# Altium schematic symbol library jlcpcb_2025_04_capacitors_extended_1210.schlib: 709 symbols (part 2 of 4) (continued)
## C3225C0G2J682JT000N
designator C?  Capacitance: 6.8nF  (hidden comment: *)
Capacitor, Ceramic (MLCC), 6.8nF, ±5%, 630V, C0G, ±5%, SMD 1210; Manufacturer: TDK; Manufacturer Part Number: C3225C0G2J682JT000N; Package Size: 1210; JLCPCB Basic Part: No; JLCPCB Part Number: C342731; Supplier 1: LCSC; Category: Capacitors - MLCC; Supplier Part Number 1: C342731; Tolerance: ±5%; Voltage Rating: 630V; Temperature Coefficient: C0G; RoHS: Yes; ComponentLink1Description: Datasheet; ComponentLink1URL: https://wmsc.lcsc.com/wmsc/upload/file/pdf/v2/lcsc/2304140030_TDK-C3225C0G2J682JT000N_C342731.pdf; ComponentLink2Description: JLCPCB Part URL; ComponentLink2URL: https://jlcpcb.com/partdetail/C342731; ComponentLink3Description: LCSC Part URL; ComponentLink3URL: https://lcsc.com/product-detail/Multilayer-Ceramic-Capacitors-MLCC---SMD-SMT_TDK-TDK-C3225C0G2J682JT000N_C342731.html
footprint CAP-1210 (1210 (3225M) Capacitor)
pins: 1, 2

## C3225C0G3A222JT000N
designator C?  Capacitance: 2.2nF  (hidden comment: *)
Capacitor, Ceramic (MLCC), 2.2nF, ±5%, 1kV, C0G, ±5%, SMD 1210; Manufacturer: TDK; Manufacturer Part Number: C3225C0G3A222JT000N; Package Size: 1210; JLCPCB Basic Part: No; JLCPCB Part Number: C2991838; Supplier 1: LCSC; Category: Capacitors - MLCC; Supplier Part Number 1: C2991838; Tolerance: ±5%; Voltage Rating: 1kV; Temperature Coefficient: C0G; RoHS: Yes; ComponentLink1Description: Datasheet; ComponentLink1URL: https://wmsc.lcsc.com/wmsc/upload/file/pdf/v2/lcsc/2204151015_TDK-C3225C0G3A222JT000N_C2991838.pdf; ComponentLink2Description: JLCPCB Part URL; ComponentLink2URL: https://jlcpcb.com/partdetail/C2991838; ComponentLink3Description: LCSC Part URL; ComponentLink3URL: https://lcsc.com/product-detail/Multilayer-Ceramic-Capacitors-MLCC---SMD-SMT_TDK-TDK-C3225C0G3A222JT000N_C2991838.html
footprint CAP-1210 (1210 (3225M) Capacitor)
pins: 1, 2

## C3225X5R0J476MT000N
designator C?  Capacitance: 47uF  (hidden comment: *)
Capacitor, Ceramic (MLCC), 47uF, ±20%, 6.3V, X5R, ±20%, SMD 1210; Manufacturer: TDK; Manufacturer Part Number: C3225X5R0J476MT000N; Package Size: 1210; JLCPCB Basic Part: No; JLCPCB Part Number: C338024; Supplier 1: LCSC; Category: Capacitors - MLCC; Supplier Part Number 1: C338024; Tolerance: ±20%; Voltage Rating: 6.3V; Temperature Coefficient: X5R; RoHS: Yes; ComponentLink1Description: Datasheet; ComponentLink1URL: https://wmsc.lcsc.com/wmsc/upload/file/pdf/v2/lcsc/2304140030_TDK-C3225X5R0J476MT000N_C338024.pdf; ComponentLink2Description: JLCPCB Part URL; ComponentLink2URL: https://jlcpcb.com/partdetail/C338024; ComponentLink3Description: LCSC Part URL; ComponentLink3URL: https://lcsc.com/product-detail/Multilayer-Ceramic-Capacitors-MLCC---SMD-SMT_TDK-TDK-C3225X5R0J476MT000N_C338024.html
footprint CAP-1210 (1210 (3225M) Capacitor)
pins: 1, 2

## C3225X5R1A336MT0A0E
designator C?  Capacitance: 33uF  (hidden comment: *)
Capacitor, Ceramic (MLCC), 33uF, ±20%, 10V, X5R, ±20%, SMD 1210; Manufacturer: TDK; Manufacturer Part Number: C3225X5R1A336MT0A0E; Package Size: 1210; JLCPCB Basic Part: No; JLCPCB Part Number: C531418; Supplier 1: LCSC; Category: Capacitors - MLCC; Supplier Part Number 1: C531418; Tolerance: ±20%; Voltage Rating: 10V; Temperature Coefficient: X5R; RoHS: Yes; ComponentLink1Description: Datasheet; ComponentLink2Description: JLCPCB Part URL; ComponentLink2URL: https://jlcpcb.com/partdetail/C531418; ComponentLink3Description: LCSC Part URL; ComponentLink3URL: https://lcsc.com/product-detail/Multilayer-Ceramic-Capacitors-MLCC---SMD-SMT_TDK-TDK-C3225X5R1A336MT0A0E_C531418.html
footprint CAP-1210 (1210 (3225M) Capacitor)
pins: 1, 2

## C3225X5R1A476MT000E
designator C?  Capacitance: 47uF  (hidden comment: *)
Capacitor, Ceramic (MLCC), 47uF, ±20%, 10V, X5R, ±20%, SMD 1210; Manufacturer: TDK; Manufacturer Part Number: C3225X5R1A476MT000E; Package Size: 1210; JLCPCB Basic Part: No; JLCPCB Part Number: C76680; Supplier 1: LCSC; Category: Capacitors - MLCC; Supplier Part Number 1: C76680; Tolerance: ±20%; Voltage Rating: 10V; Temperature Coefficient: X5R; RoHS: Yes; ComponentLink1Description: Datasheet; ComponentLink1URL: https://wmsc.lcsc.com/wmsc/upload/file/pdf/v2/lcsc/2304140030_TDK-C3225X5R1A476MT000E_C76680.pdf; ComponentLink2Description: JLCPCB Part URL; ComponentLink2URL: https://jlcpcb.com/partdetail/C76680; ComponentLink3Description: LCSC Part URL; ComponentLink3URL: https://lcsc.com/product-detail/Multilayer-Ceramic-Capacitors-MLCC---SMD-SMT_TDK-TDK-C3225X5R1A476MT000E_C76680.html
footprint CAP-1210 (1210 (3225M) Capacitor)
pins: 1, 2

## C3225X5R1C226KT000N
designator C?  Capacitance: 22uF  (hidden comment: *)
Capacitor, Ceramic (MLCC), 22uF, ±10%, 16V, X5R, ±10%, SMD 1210; Manufacturer: TDK; Manufacturer Part Number: C3225X5R1C226KT000N; Package Size: 1210; JLCPCB Basic Part: No; JLCPCB Part Number: C329935; Supplier 1: LCSC; Category: Capacitors - MLCC; Supplier Part Number 1: C329935; Tolerance: ±10%; Voltage Rating: 16V; Temperature Coefficient: X5R; RoHS: Yes; ComponentLink1Description: Datasheet; ComponentLink1URL: https://wmsc.lcsc.com/wmsc/upload/file/pdf/v2/lcsc/2304140030_TDK-C3225X5R1C226KT000N_C329935.pdf; ComponentLink2Description: JLCPCB Part URL; ComponentLink2URL: https://jlcpcb.com/partdetail/C329935; ComponentLink3Description: LCSC Part URL; ComponentLink3URL: https://lcsc.com/product-detail/Multilayer-Ceramic-Capacitors-MLCC---SMD-SMT_TDK-TDK-C3225X5R1C226KT000N_C329935.html
footprint CAP-1210 (1210 (3225M) Capacitor)
pins: 1, 2

## C3225X5R1C226MT000N
designator C?  Capacitance: 22uF  (hidden comment: *)
Capacitor, Ceramic (MLCC), 22uF, ±20%, 16V, X5R, ±20%, SMD 1210; Manufacturer: TDK; Manufacturer Part Number: C3225X5R1C226MT000N; Package Size: 1210; JLCPCB Basic Part: No; JLCPCB Part Number: C329959; Supplier 1: LCSC; Category: Capacitors - MLCC; Supplier Part Number 1: C329959; Tolerance: ±20%; Voltage Rating: 16V; Temperature Coefficient: X5R; RoHS: Yes; ComponentLink1Description: Datasheet; ComponentLink1URL: https://wmsc.lcsc.com/wmsc/upload/file/pdf/v2/lcsc/2304140030_TDK-C3225X5R1C226MT000N_C329959.pdf; ComponentLink2Description: JLCPCB Part URL; ComponentLink2URL: https://jlcpcb.com/partdetail/C329959; ComponentLink3Description: LCSC Part URL; ComponentLink3URL: https://lcsc.com/product-detail/Multilayer-Ceramic-Capacitors-MLCC---SMD-SMT_TDK-TDK-C3225X5R1C226MT000N_C329959.html
footprint CAP-1210 (1210 (3225M) Capacitor)
pins: 1, 2

## C3225X5R1E106KTJ00E
designator C?  Capacitance: 10uF  (hidden comment: *)
Capacitor, Ceramic (MLCC), 10uF, ±10%, 25V, X5R, ±10%, SMD 1210; Manufacturer: TDK; Manufacturer Part Number: C3225X5R1E106KTJ00E; Package Size: 1210; JLCPCB Basic Part: No; JLCPCB Part Number: C319188; Supplier 1: LCSC; Category: Capacitors - MLCC; Supplier Part Number 1: C319188; Tolerance: ±10%; Voltage Rating: 25V; Temperature Coefficient: X5R; RoHS: Yes; ComponentLink1Description: Datasheet; ComponentLink1URL: https://wmsc.lcsc.com/wmsc/upload/file/pdf/v2/lcsc/2304140030_TDK-C3225X5R1E106KTJ00E_C319188.pdf; ComponentLink2Description: JLCPCB Part URL; ComponentLink2URL: https://jlcpcb.com/partdetail/C319188; ComponentLink3Description: LCSC Part URL; ComponentLink3URL: https://lcsc.com/product-detail/Multilayer-Ceramic-Capacitors-MLCC---SMD-SMT_TDK-TDK-C3225X5R1E106KTJ00E_C319188.html
footprint CAP-1210 (1210 (3225M) Capacitor)
pins: 1, 2

## C3225X5R1E106MTJ00N
designator C?  Capacitance: 10uF  (hidden comment: *)
Capacitor, Ceramic (MLCC), 10uF, ±20%, 25V, X5R, ±20%, SMD 1210; Manufacturer: TDK; Manufacturer Part Number: C3225X5R1E106MTJ00N; Package Size: 1210; JLCPCB Basic Part: No; JLCPCB Part Number: C338001; Supplier 1: LCSC; Category: Capacitors - MLCC; Supplier Part Number 1: C338001; Tolerance: ±20%; Voltage Rating: 25V; Temperature Coefficient: X5R; RoHS: Yes; ComponentLink1Description: Datasheet; ComponentLink1URL: https://wmsc.lcsc.com/wmsc/upload/file/pdf/v2/lcsc/2304140030_TDK-C3225X5R1E106MTJ00N_C338001.pdf; ComponentLink2Description: JLCPCB Part URL; ComponentLink2URL: https://jlcpcb.com/partdetail/C338001; ComponentLink3Description: LCSC Part URL; ComponentLink3URL: https://lcsc.com/product-detail/Multilayer-Ceramic-Capacitors-MLCC---SMD-SMT_TDK-TDK-C3225X5R1E106MTJ00N_C338001.html
footprint CAP-1210 (1210 (3225M) Capacitor)
pins: 1, 2

## C3225X5R1E226KT000E
designator C?  Capacitance: 22uF  (hidden comment: *)
Capacitor, Ceramic (MLCC), 22uF, ±10%, 25V, X5R, ±10%, SMD 1210; Manufacturer: TDK; Manufacturer Part Number: C3225X5R1E226KT000E; Package Size: 1210; JLCPCB Basic Part: No; JLCPCB Part Number: C531419; Supplier 1: LCSC; Category: Capacitors - MLCC; Supplier Part Number 1: C531419; Tolerance: ±10%; Voltage Rating: 25V; Temperature Coefficient: X5R; RoHS: Yes; ComponentLink1Description: Datasheet; ComponentLink2Description: JLCPCB Part URL; ComponentLink2URL: https://jlcpcb.com/partdetail/C531419; ComponentLink3Description: LCSC Part URL; ComponentLink3URL: https://lcsc.com/product-detail/Multilayer-Ceramic-Capacitors-MLCC---SMD-SMT_TDK-TDK-C3225X5R1E226KT000E_C531419.html
footprint CAP-1210 (1210 (3225M) Capacitor)
pins: 1, 2

## C3225X5R1E226MT000E
designator C?  Capacitance: 22uF  (hidden comment: *)
Capacitor, Ceramic (MLCC), 22uF, ±20%, 25V, X5R, ±20%, SMD 1210; Manufacturer: TDK; Manufacturer Part Number: C3225X5R1E226MT000E; Package Size: 1210; JLCPCB Basic Part: No; JLCPCB Part Number: C329939; Supplier 1: LCSC; Category: Capacitors - MLCC; Supplier Part Number 1: C329939; Tolerance: ±20%; Voltage Rating: 25V; Temperature Coefficient: X5R; RoHS: Yes; ComponentLink1Description: Datasheet; ComponentLink1URL: https://wmsc.lcsc.com/wmsc/upload/file/pdf/v2/lcsc/2304140030_TDK-C3225X5R1E226MT000E_C329939.pdf; ComponentLink2Description: JLCPCB Part URL; ComponentLink2URL: https://jlcpcb.com/partdetail/C329939; ComponentLink3Description: LCSC Part URL; ComponentLink3URL: https://lcsc.com/product-detail/Multilayer-Ceramic-Capacitors-MLCC---SMD-SMT_TDK-TDK-C3225X5R1E226MT000E_C329939.html
footprint CAP-1210 (1210 (3225M) Capacitor)
pins: 1, 2

## C3225X5R1H106KT000N
designator C?  Capacitance: 10uF  (hidden comment: *)
Capacitor, Ceramic (MLCC), 10uF, ±10%, 50V, X5R, ±10%, SMD 1210; Manufacturer: TDK; Manufacturer Part Number: C3225X5R1H106KT000N; Package Size: 1210; JLCPCB Basic Part: No; JLCPCB Part Number: C342671; Supplier 1: LCSC; Category: Capacitors - MLCC; Supplier Part Number 1: C342671; Tolerance: ±10%; Voltage Rating: 50V; Temperature Coefficient: X5R; RoHS: Yes; ComponentLink1Description: Datasheet; ComponentLink1URL: https://wmsc.lcsc.com/wmsc/upload/file/pdf/v2/lcsc/2304140030_TDK-C3225X5R1H106KT000N_C342671.pdf; ComponentLink2Description: JLCPCB Part URL; ComponentLink2URL: https://jlcpcb.com/partdetail/C342671; ComponentLink3Description: LCSC Part URL; ComponentLink3URL: https://lcsc.com/product-detail/Multilayer-Ceramic-Capacitors-MLCC---SMD-SMT_TDK-TDK-C3225X5R1H106KT000N_C342671.html
footprint CAP-1210 (1210 (3225M) Capacitor)
pins: 1, 2

## C3225X7R1A226MTJ00N
designator C?  Capacitance: 22uF  (hidden comment: *)
Capacitor, Ceramic (MLCC), 22uF, ±20%, 10V, X7R, ±20%, SMD 1210; Manufacturer: TDK; Manufacturer Part Number: C3225X7R1A226MTJ00N; Package Size: 1210; JLCPCB Basic Part: No; JLCPCB Part Number: C695363; Supplier 1: LCSC; Category: Capacitors - MLCC; Supplier Part Number 1: C695363; Tolerance: ±20%; Voltage Rating: 10V; Temperature Coefficient: X7R; RoHS: Yes; ComponentLink1Description: Datasheet; ComponentLink1URL: https://wmsc.lcsc.com/wmsc/upload/file/pdf/v2/lcsc/2304140030_TDK-C3225X7R1A226MTJ00N_C695363.pdf; ComponentLink2Description: JLCPCB Part URL; ComponentLink2URL: https://jlcpcb.com/partdetail/C695363; ComponentLink3Description: LCSC Part URL; ComponentLink3URL: https://lcsc.com/product-detail/Multilayer-Ceramic-Capacitors-MLCC---SMD-SMT_TDK-TDK-C3225X7R1A226MTJ00N_C695363.html
footprint CAP-1210 (1210 (3225M) Capacitor)
pins: 1, 2

## C3225X7R1C106KT000N
designator C?  Capacitance: 10uF  (hidden comment: *)
Capacitor, Ceramic (MLCC), 10uF, ±10%, 16V, X7R, ±10%, SMD 1210; Manufacturer: TDK; Manufacturer Part Number: C3225X7R1C106KT000N; Package Size: 1210; JLCPCB Basic Part: No; JLCPCB Part Number: C319189; Supplier 1: LCSC; Category: Capacitors - MLCC; Supplier Part Number 1: C319189; Tolerance: ±10%; Voltage Rating: 16V; Temperature Coefficient: X7R; RoHS: Yes; ComponentLink1Description: Datasheet; ComponentLink1URL: https://wmsc.lcsc.com/wmsc/upload/file/pdf/v2/lcsc/2304140030_TDK-C3225X7R1C106KT000N_C319189.pdf; ComponentLink2Description: JLCPCB Part URL; ComponentLink2URL: https://jlcpcb.com/partdetail/C319189; ComponentLink3Description: LCSC Part URL; ComponentLink3URL: https://lcsc.com/product-detail/Multilayer-Ceramic-Capacitors-MLCC---SMD-SMT_TDK-TDK-C3225X7R1C106KT000N_C319189.html
footprint CAP-1210 (1210 (3225M) Capacitor)
pins: 1, 2

## C3225X7R1C156MT000N
designator C?  Capacitance: 15uF  (hidden comment: *)
Capacitor, Ceramic (MLCC), 15uF, ±20%, 16V, X7R, ±20%, SMD 1210; Manufacturer: TDK; Manufacturer Part Number: C3225X7R1C156MT000N; Package Size: 1210; JLCPCB Basic Part: No; JLCPCB Part Number: C694469; Supplier 1: LCSC; Category: Capacitors - MLCC; Supplier Part Number 1: C694469; Tolerance: ±20%; Voltage Rating: 16V; Temperature Coefficient: X7R; RoHS: Yes; ComponentLink1Description: Datasheet; ComponentLink1URL: https://wmsc.lcsc.com/wmsc/upload/file/pdf/v2/lcsc/2304140030_TDK-C3225X7R1C156MT000N_C694469.pdf; ComponentLink2Description: JLCPCB Part URL; ComponentLink2URL: https://jlcpcb.com/partdetail/C694469; ComponentLink3Description: LCSC Part URL; ComponentLink3URL: https://lcsc.com/product-detail/Multilayer-Ceramic-Capacitors-MLCC---SMD-SMT_TDK-TDK-C3225X7R1C156MT000N_C694469.html
footprint CAP-1210 (1210 (3225M) Capacitor)
pins: 1, 2

## C3225X7R1C226KT000N
designator C?  Capacitance: 22uF  (hidden comment: *)
Capacitor, Ceramic (MLCC), 22uF, ±10%, 16V, X7R, ±10%, SMD 1210; Manufacturer: TDK; Manufacturer Part Number: C3225X7R1C226KT000N; Package Size: 1210; JLCPCB Basic Part: No; JLCPCB Part Number: C342660; Supplier 1: LCSC; Category: Capacitors - MLCC; Supplier Part Number 1: C342660; Tolerance: ±10%; Voltage Rating: 16V; Temperature Coefficient: X7R; RoHS: Yes; ComponentLink1Description: Datasheet; ComponentLink1URL: https://wmsc.lcsc.com/wmsc/upload/file/pdf/v2/lcsc/2304140030_TDK-C3225X7R1C226KT000N_C342660.pdf; ComponentLink2Description: JLCPCB Part URL; ComponentLink2URL: https://jlcpcb.com/partdetail/C342660; ComponentLink3Description: LCSC Part URL; ComponentLink3URL: https://lcsc.com/product-detail/Multilayer-Ceramic-Capacitors-MLCC---SMD-SMT_TDK-TDK-C3225X7R1C226KT000N_C342660.html
footprint CAP-1210 (1210 (3225M) Capacitor)
pins: 1, 2

## C3225X7R1C226MT000N
designator C?  Capacitance: 22uF  (hidden comment: *)
Capacitor, Ceramic (MLCC), 22uF, ±20%, 16V, X7R, ±20%, SMD 1210; Manufacturer: TDK; Manufacturer Part Number: C3225X7R1C226MT000N; Package Size: 1210; JLCPCB Basic Part: No; JLCPCB Part Number: C342699; Supplier 1: LCSC; Category: Capacitors - MLCC; Supplier Part Number 1: C342699; Tolerance: ±20%; Voltage Rating: 16V; Temperature Coefficient: X7R; RoHS: Yes; ComponentLink1Description: Datasheet; ComponentLink1URL: https://wmsc.lcsc.com/wmsc/upload/file/pdf/v2/lcsc/2304140030_TDK-C3225X7R1C226MT000N_C342699.pdf; ComponentLink2Description: JLCPCB Part URL; ComponentLink2URL: https://jlcpcb.com/partdetail/C342699; ComponentLink3Description: LCSC Part URL; ComponentLink3URL: https://lcsc.com/product-detail/Multilayer-Ceramic-Capacitors-MLCC---SMD-SMT_TDK-TDK-C3225X7R1C226MT000N_C342699.html
footprint CAP-1210 (1210 (3225M) Capacitor)
pins: 1, 2

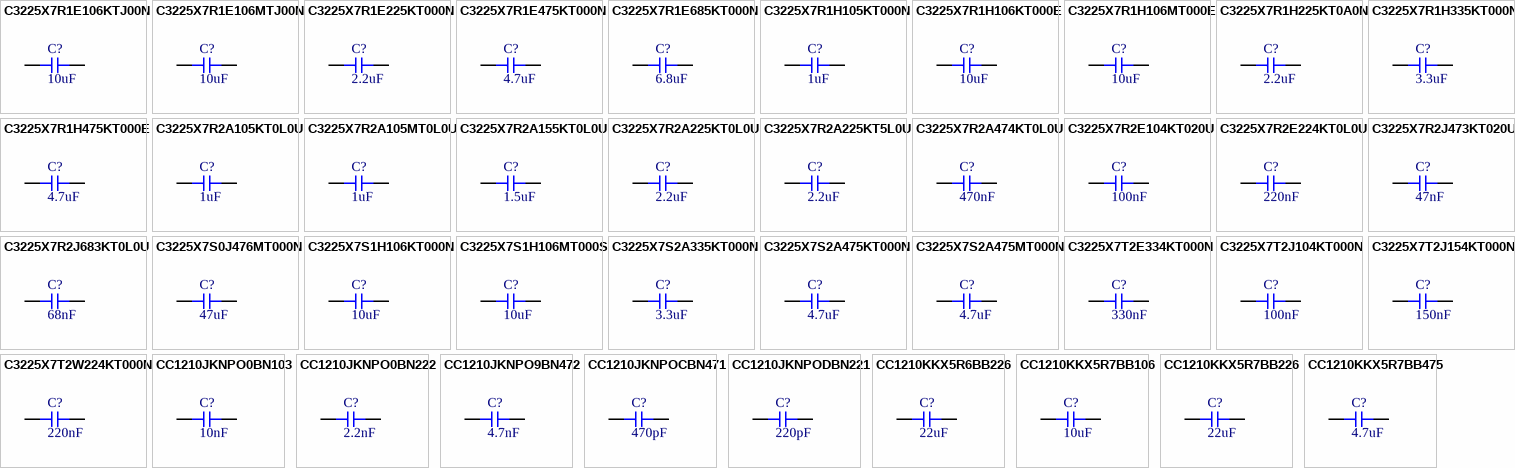
[diagram p6: symbols C3225X7R1E106KTJ00N to CC1210KKX5R7BB475]

## C3225X7R1E106KTJ00N
designator C?  Capacitance: 10uF  (hidden comment: *)
Capacitor, Ceramic (MLCC), 10uF, ±10%, 25V, X7R, ±10%, SMD 1210; Manufacturer: TDK; Manufacturer Part Number: C3225X7R1E106KTJ00N; Package Size: 1210; JLCPCB Basic Part: No; JLCPCB Part Number: C342744; Supplier 1: LCSC; Category: Capacitors - MLCC; Supplier Part Number 1: C342744; Tolerance: ±10%; Voltage Rating: 25V; Temperature Coefficient: X7R; RoHS: Yes; ComponentLink1Description: Datasheet; ComponentLink1URL: https://wmsc.lcsc.com/wmsc/upload/file/pdf/v2/lcsc/2304140030_TDK-C3225X7R1E106KTJ00N_C342744.pdf; ComponentLink2Description: JLCPCB Part URL; ComponentLink2URL: https://jlcpcb.com/partdetail/C342744; ComponentLink3Description: LCSC Part URL; ComponentLink3URL: https://lcsc.com/product-detail/Multilayer-Ceramic-Capacitors-MLCC---SMD-SMT_TDK-TDK-C3225X7R1E106KTJ00N_C342744.html
footprint CAP-1210 (1210 (3225M) Capacitor)
pins: 1, 2

## C3225X7R1E106MTJ00N
designator C?  Capacitance: 10uF  (hidden comment: *)
Capacitor, Ceramic (MLCC), 10uF, ±20%, 25V, X7R, ±20%, SMD 1210; Manufacturer: TDK; Manufacturer Part Number: C3225X7R1E106MTJ00N; Package Size: 1210; JLCPCB Basic Part: No; JLCPCB Part Number: C694198; Supplier 1: LCSC; Category: Capacitors - MLCC; Supplier Part Number 1: C694198; Tolerance: ±20%; Voltage Rating: 25V; Temperature Coefficient: X7R; RoHS: Yes; ComponentLink1Description: Datasheet; ComponentLink1URL: https://wmsc.lcsc.com/wmsc/upload/file/pdf/v2/lcsc/2304140030_TDK-C3225X7R1E106MTJ00N_C694198.pdf; ComponentLink2Description: JLCPCB Part URL; ComponentLink2URL: https://jlcpcb.com/partdetail/C694198; ComponentLink3Description: LCSC Part URL; ComponentLink3URL: https://lcsc.com/product-detail/Multilayer-Ceramic-Capacitors-MLCC---SMD-SMT_TDK-TDK-C3225X7R1E106MTJ00N_C694198.html
footprint CAP-1210 (1210 (3225M) Capacitor)
pins: 1, 2

## C3225X7R1E225KT000N
designator C?  Capacitance: 2.2uF  (hidden comment: *)
Capacitor, Ceramic (MLCC), 2.2uF, ±10%, 25V, X7R, ±10%, SMD 1210; Manufacturer: TDK; Manufacturer Part Number: C3225X7R1E225KT000N; Package Size: 1210; JLCPCB Basic Part: No; JLCPCB Part Number: C76681; Supplier 1: LCSC; Category: Capacitors - MLCC; Supplier Part Number 1: C76681; Tolerance: ±10%; Voltage Rating: 25V; Temperature Coefficient: X7R; RoHS: Yes; ComponentLink1Description: Datasheet; ComponentLink1URL: https://wmsc.lcsc.com/wmsc/upload/file/pdf/v2/lcsc/2304140030_TDK-C3225X7R1E225KT000N_C76681.pdf; ComponentLink2Description: JLCPCB Part URL; ComponentLink2URL: https://jlcpcb.com/partdetail/C76681; ComponentLink3Description: LCSC Part URL; ComponentLink3URL: https://lcsc.com/product-detail/Multilayer-Ceramic-Capacitors-MLCC---SMD-SMT_TDK-TDK-C3225X7R1E225KT000N_C76681.html
footprint CAP-1210 (1210 (3225M) Capacitor)
pins: 1, 2

## C3225X7R1E475KT000N
designator C?  Capacitance: 4.7uF  (hidden comment: *)
Capacitor, Ceramic (MLCC), 4.7uF, ±10%, 25V, X7R, ±10%, SMD 1210; Manufacturer: TDK; Manufacturer Part Number: C3225X7R1E475KT000N; Package Size: 1210; JLCPCB Basic Part: No; JLCPCB Part Number: C694471; Supplier 1: LCSC; Category: Capacitors - MLCC; Supplier Part Number 1: C694471; Tolerance: ±10%; Voltage Rating: 25V; Temperature Coefficient: X7R; RoHS: Yes; ComponentLink1Description: Datasheet; ComponentLink1URL: https://wmsc.lcsc.com/wmsc/upload/file/pdf/v2/lcsc/2304140030_TDK-C3225X7R1E475KT000N_C694471.pdf; ComponentLink2Description: JLCPCB Part URL; ComponentLink2URL: https://jlcpcb.com/partdetail/C694471; ComponentLink3Description: LCSC Part URL; ComponentLink3URL: https://lcsc.com/product-detail/Multilayer-Ceramic-Capacitors-MLCC---SMD-SMT_TDK-TDK-C3225X7R1E475KT000N_C694471.html
footprint CAP-1210 (1210 (3225M) Capacitor)
pins: 1, 2

## C3225X7R1E685KT000N
designator C?  Capacitance: 6.8uF  (hidden comment: *)
Capacitor, Ceramic (MLCC), 6.8uF, ±10%, 25V, X7R, ±10%, SMD 1210; Manufacturer: TDK; Manufacturer Part Number: C3225X7R1E685KT000N; Package Size: 1210; JLCPCB Basic Part: No; JLCPCB Part Number: C342705; Supplier 1: LCSC; Category: Capacitors - MLCC; Supplier Part Number 1: C342705; Tolerance: ±10%; Voltage Rating: 25V; Temperature Coefficient: X7R; RoHS: Yes; ComponentLink1Description: Datasheet; ComponentLink1URL: https://wmsc.lcsc.com/wmsc/upload/file/pdf/v2/lcsc/2304140030_TDK-C3225X7R1E685KT000N_C342705.pdf; ComponentLink2Description: JLCPCB Part URL; ComponentLink2URL: https://jlcpcb.com/partdetail/C342705; ComponentLink3Description: LCSC Part URL; ComponentLink3URL: https://lcsc.com/product-detail/Multilayer-Ceramic-Capacitors-MLCC---SMD-SMT_TDK-TDK-C3225X7R1E685KT000N_C342705.html
footprint CAP-1210 (1210 (3225M) Capacitor)
pins: 1, 2

## C3225X7R1H105KT000N
designator C?  Capacitance: 1uF  (hidden comment: *)
Capacitor, Ceramic (MLCC), 1uF, ±10%, 50V, X7R, ±10%, SMD 1210; Manufacturer: TDK; Manufacturer Part Number: C3225X7R1H105KT000N; Package Size: 1210; JLCPCB Basic Part: No; JLCPCB Part Number: C531420; Supplier 1: LCSC; Category: Capacitors - MLCC; Supplier Part Number 1: C531420; Tolerance: ±10%; Voltage Rating: 50V; Temperature Coefficient: X7R; RoHS: Yes; ComponentLink1Description: Datasheet; ComponentLink2Description: JLCPCB Part URL; ComponentLink2URL: https://jlcpcb.com/partdetail/C531420; ComponentLink3Description: LCSC Part URL; ComponentLink3URL: https://lcsc.com/product-detail/Multilayer-Ceramic-Capacitors-MLCC---SMD-SMT_TDK-TDK-C3225X7R1H105KT000N_C531420.html
footprint CAP-1210 (1210 (3225M) Capacitor)
pins: 1, 2

## C3225X7R1H106KT000E
designator C?  Capacitance: 10uF  (hidden comment: *)
Capacitor, Ceramic (MLCC), 10uF, ±10%, 50V, X7R, ±10%, SMD 1210; Manufacturer: TDK; Manufacturer Part Number: C3225X7R1H106KT000E; Package Size: 1210; JLCPCB Basic Part: No; JLCPCB Part Number: C432929; Supplier 1: LCSC; Category: Capacitors - MLCC; Supplier Part Number 1: C432929; Tolerance: ±10%; Voltage Rating: 50V; Temperature Coefficient: X7R; RoHS: Yes; ComponentLink1Description: Datasheet; ComponentLink1URL: https://wmsc.lcsc.com/wmsc/upload/file/pdf/v2/lcsc/2304140030_TDK-C3225X7R1H106KT000E_C432929.pdf; ComponentLink2Description: JLCPCB Part URL; ComponentLink2URL: https://jlcpcb.com/partdetail/C432929; ComponentLink3Description: LCSC Part URL; ComponentLink3URL: https://lcsc.com/product-detail/Multilayer-Ceramic-Capacitors-MLCC---SMD-SMT_TDK-TDK-C3225X7R1H106KT000E_C432929.html
footprint CAP-1210 (1210 (3225M) Capacitor)
pins: 1, 2

## C3225X7R1H106MT000E
designator C?  Capacitance: 10uF  (hidden comment: *)
Capacitor, Ceramic (MLCC), 10uF, ±20%, 50V, X7R, ±20%, SMD 1210; Manufacturer: TDK; Manufacturer Part Number: C3225X7R1H106MT000E; Package Size: 1210; JLCPCB Basic Part: No; JLCPCB Part Number: C342670; Supplier 1: LCSC; Category: Capacitors - MLCC; Supplier Part Number 1: C342670; Tolerance: ±20%; Voltage Rating: 50V; Temperature Coefficient: X7R; RoHS: Yes; ComponentLink1Description: Datasheet; ComponentLink1URL: https://wmsc.lcsc.com/wmsc/upload/file/pdf/v2/lcsc/2304140030_TDK-C3225X7R1H106MT000E_C342670.pdf; ComponentLink2Description: JLCPCB Part URL; ComponentLink2URL: https://jlcpcb.com/partdetail/C342670; ComponentLink3Description: LCSC Part URL; ComponentLink3URL: https://lcsc.com/product-detail/Multilayer-Ceramic-Capacitors-MLCC---SMD-SMT_TDK-TDK-C3225X7R1H106MT000E_C342670.html
footprint CAP-1210 (1210 (3225M) Capacitor)
pins: 1, 2

## C3225X7R1H225KT0A0N
designator C?  Capacitance: 2.2uF  (hidden comment: *)
Capacitor, Ceramic (MLCC), 2.2uF, ±10%, 50V, X7R, ±10%, SMD 1210; Manufacturer: TDK; Manufacturer Part Number: C3225X7R1H225KT0A0N; Package Size: 1210; JLCPCB Basic Part: No; JLCPCB Part Number: C695364; Supplier 1: LCSC; Category: Capacitors - MLCC; Supplier Part Number 1: C695364; Tolerance: ±10%; Voltage Rating: 50V; Temperature Coefficient: X7R; RoHS: Yes; ComponentLink1Description: Datasheet; ComponentLink1URL: https://wmsc.lcsc.com/wmsc/upload/file/pdf/v2/lcsc/2304140030_TDK-C3225X7R1H225KT0A0N_C695364.pdf; ComponentLink2Description: JLCPCB Part URL; ComponentLink2URL: https://jlcpcb.com/partdetail/C695364; ComponentLink3Description: LCSC Part URL; ComponentLink3URL: https://lcsc.com/product-detail/Multilayer-Ceramic-Capacitors-MLCC---SMD-SMT_TDK-TDK-C3225X7R1H225KT0A0N_C695364.html
footprint CAP-1210 (1210 (3225M) Capacitor)
pins: 1, 2

## C3225X7R1H335KT000N
designator C?  Capacitance: 3.3uF  (hidden comment: *)
Capacitor, Ceramic (MLCC), 3.3uF, ±10%, 50V, X7R, ±10%, SMD 1210; Manufacturer: TDK; Manufacturer Part Number: C3225X7R1H335KT000N; Package Size: 1210; JLCPCB Basic Part: No; JLCPCB Part Number: C117474; Supplier 1: LCSC; Category: Capacitors - MLCC; Supplier Part Number 1: C117474; Tolerance: ±10%; Voltage Rating: 50V; Temperature Coefficient: X7R; RoHS: Yes; ComponentLink1Description: Datasheet; ComponentLink1URL: https://wmsc.lcsc.com/wmsc/upload/file/pdf/v2/lcsc/1810201234_TDK-C3225X7R1H335KT000N_C117474.pdf; ComponentLink2Description: JLCPCB Part URL; ComponentLink2URL: https://jlcpcb.com/partdetail/C117474; ComponentLink3Description: LCSC Part URL; ComponentLink3URL: https://lcsc.com/product-detail/Multilayer-Ceramic-Capacitors-MLCC---SMD-SMT_TDK-TDK-C3225X7R1H335KT000N_C117474.html
footprint CAP-1210 (1210 (3225M) Capacitor)
pins: 1, 2

## C3225X7R1H475KT000E
designator C?  Capacitance: 4.7uF  (hidden comment: *)
Capacitor, Ceramic (MLCC), 4.7uF, ±10%, 50V, X7R, ±10%, SMD 1210; Manufacturer: TDK; Manufacturer Part Number: C3225X7R1H475KT000E; Package Size: 1210; JLCPCB Basic Part: No; JLCPCB Part Number: C76684; Supplier 1: LCSC; Category: Capacitors - MLCC; Supplier Part Number 1: C76684; Tolerance: ±10%; Voltage Rating: 50V; Temperature Coefficient: X7R; RoHS: Yes; ComponentLink1Description: Datasheet; ComponentLink1URL: https://wmsc.lcsc.com/wmsc/upload/file/pdf/v2/lcsc/2304140030_TDK-C3225X7R1H475KT000E_C76684.pdf; ComponentLink2Description: JLCPCB Part URL; ComponentLink2URL: https://jlcpcb.com/partdetail/C76684; ComponentLink3Description: LCSC Part URL; ComponentLink3URL: https://lcsc.com/product-detail/Multilayer-Ceramic-Capacitors-MLCC---SMD-SMT_TDK-TDK-C3225X7R1H475KT000E_C76684.html
footprint CAP-1210 (1210 (3225M) Capacitor)
pins: 1, 2

## C3225X7R2A105KT0L0U
designator C?  Capacitance: 1uF  (hidden comment: *)
Capacitor, Ceramic (MLCC), 1uF, ±10%, 100V, X7R, ±10%, SMD 1210; Manufacturer: TDK; Manufacturer Part Number: C3225X7R2A105KT0L0U; Package Size: 1210; JLCPCB Basic Part: No; JLCPCB Part Number: C342729; Supplier 1: LCSC; Category: Capacitors - MLCC; Supplier Part Number 1: C342729; Tolerance: ±10%; Voltage Rating: 100V; Temperature Coefficient: X7R; RoHS: Yes; ComponentLink1Description: Datasheet; ComponentLink1URL: https://wmsc.lcsc.com/wmsc/upload/file/pdf/v2/lcsc/2304140030_TDK-C3225X7R2A105KT0L0U_C342729.pdf; ComponentLink2Description: JLCPCB Part URL; ComponentLink2URL: https://jlcpcb.com/partdetail/C342729; ComponentLink3Description: LCSC Part URL; ComponentLink3URL: https://lcsc.com/product-detail/Multilayer-Ceramic-Capacitors-MLCC---SMD-SMT_TDK-TDK-C3225X7R2A105KT0L0U_C342729.html
footprint CAP-1210 (1210 (3225M) Capacitor)
pins: 1, 2

## C3225X7R2A105MT0L0U
designator C?  Capacitance: 1uF  (hidden comment: *)
Capacitor, Ceramic (MLCC), 1uF, ±20%, 100V, X7R, ±20%, SMD 1210; Manufacturer: TDK; Manufacturer Part Number: C3225X7R2A105MT0L0U; Package Size: 1210; JLCPCB Basic Part: No; JLCPCB Part Number: C342730; Supplier 1: LCSC; Category: Capacitors - MLCC; Supplier Part Number 1: C342730; Tolerance: ±20%; Voltage Rating: 100V; Temperature Coefficient: X7R; RoHS: Yes; ComponentLink1Description: Datasheet; ComponentLink1URL: https://wmsc.lcsc.com/wmsc/upload/file/pdf/v2/lcsc/2304140030_TDK-C3225X7R2A105MT0L0U_C342730.pdf; ComponentLink2Description: JLCPCB Part URL; ComponentLink2URL: https://jlcpcb.com/partdetail/C342730; ComponentLink3Description: LCSC Part URL; ComponentLink3URL: https://lcsc.com/product-detail/Multilayer-Ceramic-Capacitors-MLCC---SMD-SMT_TDK-TDK-C3225X7R2A105MT0L0U_C342730.html
footprint CAP-1210 (1210 (3225M) Capacitor)
pins: 1, 2

## C3225X7R2A155KT0L0U
designator C?  Capacitance: 1.5uF  (hidden comment: *)
Capacitor, Ceramic (MLCC), 1.5uF, ±10%, 100V, X7R, ±10%, SMD 1210; Manufacturer: TDK; Manufacturer Part Number: C3225X7R2A155KT0L0U; Package Size: 1210; JLCPCB Basic Part: No; JLCPCB Part Number: C342711; Supplier 1: LCSC; Category: Capacitors - MLCC; Supplier Part Number 1: C342711; Tolerance: ±10%; Voltage Rating: 100V; Temperature Coefficient: X7R; RoHS: Yes; ComponentLink1Description: Datasheet; ComponentLink1URL: https://wmsc.lcsc.com/wmsc/upload/file/pdf/v2/lcsc/2304140030_TDK-C3225X7R2A155KT0L0U_C342711.pdf; ComponentLink2Description: JLCPCB Part URL; ComponentLink2URL: https://jlcpcb.com/partdetail/C342711; ComponentLink3Description: LCSC Part URL; ComponentLink3URL: https://lcsc.com/product-detail/Multilayer-Ceramic-Capacitors-MLCC---SMD-SMT_TDK-TDK-C3225X7R2A155KT0L0U_C342711.html
footprint CAP-1210 (1210 (3225M) Capacitor)
pins: 1, 2

## C3225X7R2A225KT0L0U
designator C?  Capacitance: 2.2uF  (hidden comment: *)
Capacitor, Ceramic (MLCC), 2.2uF, ±10%, 100V, X7R, ±10%, SMD 1210; Manufacturer: TDK; Manufacturer Part Number: C3225X7R2A225KT0L0U; Package Size: 1210; JLCPCB Basic Part: No; JLCPCB Part Number: C76685; Supplier 1: LCSC; Category: Capacitors - MLCC; Supplier Part Number 1: C76685; Tolerance: ±10%; Voltage Rating: 100V; Temperature Coefficient: X7R; RoHS: Yes; ComponentLink1Description: Datasheet; ComponentLink1URL: https://wmsc.lcsc.com/wmsc/upload/file/pdf/v2/lcsc/2304140030_TDK-C3225X7R2A225KT0L0U_C76685.pdf; ComponentLink2Description: JLCPCB Part URL; ComponentLink2URL: https://jlcpcb.com/partdetail/C76685; ComponentLink3Description: LCSC Part URL; ComponentLink3URL: https://lcsc.com/product-detail/Multilayer-Ceramic-Capacitors-MLCC---SMD-SMT_TDK-TDK-C3225X7R2A225KT0L0U_C76685.html
footprint CAP-1210 (1210 (3225M) Capacitor)
pins: 1, 2

## C3225X7R2A225KT5L0U
designator C?  Capacitance: 2.2uF  (hidden comment: *)
Capacitor, Ceramic (MLCC), 2.2uF, ±10%, 100V, X7R, ±10%, SMD 1210; Manufacturer: TDK; Manufacturer Part Number: C3225X7R2A225KT5L0U; Package Size: 1210; JLCPCB Basic Part: No; JLCPCB Part Number: C76686; Supplier 1: LCSC; Category: Capacitors - MLCC; Supplier Part Number 1: C76686; Tolerance: ±10%; Voltage Rating: 100V; Temperature Coefficient: X7R; RoHS: Yes; ComponentLink1Description: Datasheet; ComponentLink1URL: https://wmsc.lcsc.com/wmsc/upload/file/pdf/v2/lcsc/2304140030_TDK-C3225X7R2A225KT5L0U_C76686.pdf; ComponentLink2Description: JLCPCB Part URL; ComponentLink2URL: https://jlcpcb.com/partdetail/C76686; ComponentLink3Description: LCSC Part URL; ComponentLink3URL: https://lcsc.com/product-detail/Multilayer-Ceramic-Capacitors-MLCC---SMD-SMT_TDK-TDK-C3225X7R2A225KT5L0U_C76686.html
footprint CAP-1210 (1210 (3225M) Capacitor)
pins: 1, 2

## C3225X7R2A474KT0L0U
designator C?  Capacitance: 470nF  (hidden comment: *)
Capacitor, Ceramic (MLCC), 470nF, ±10%, 100V, X7R, ±10%, SMD 1210; Manufacturer: TDK; Manufacturer Part Number: C3225X7R2A474KT0L0U; Package Size: 1210; JLCPCB Basic Part: No; JLCPCB Part Number: C76687; Supplier 1: LCSC; Category: Capacitors - MLCC; Supplier Part Number 1: C76687; Tolerance: ±10%; Voltage Rating: 100V; Temperature Coefficient: X7R; RoHS: Yes; ComponentLink1Description: Datasheet; ComponentLink1URL: https://wmsc.lcsc.com/wmsc/upload/file/pdf/v2/lcsc/2304140030_TDK-C3225X7R2A474KT0L0U_C76687.pdf; ComponentLink2Description: JLCPCB Part URL; ComponentLink2URL: https://jlcpcb.com/partdetail/C76687; ComponentLink3Description: LCSC Part URL; ComponentLink3URL: https://lcsc.com/product-detail/Multilayer-Ceramic-Capacitors-MLCC---SMD-SMT_TDK-TDK-C3225X7R2A474KT0L0U_C76687.html
footprint CAP-1210 (1210 (3225M) Capacitor)
pins: 1, 2

## C3225X7R2E104KT020U
designator C?  Capacitance: 100nF  (hidden comment: *)
Capacitor, Ceramic (MLCC), 100nF, ±10%, 250V, X7R, ±10%, SMD 1210; Manufacturer: TDK; Manufacturer Part Number: C3225X7R2E104KT020U; Package Size: 1210; JLCPCB Basic Part: No; JLCPCB Part Number: C76688; Supplier 1: LCSC; Category: Capacitors - MLCC; Supplier Part Number 1: C76688; Tolerance: ±10%; Voltage Rating: 250V; Temperature Coefficient: X7R; RoHS: Yes; ComponentLink1Description: Datasheet; ComponentLink1URL: https://wmsc.lcsc.com/wmsc/upload/file/pdf/v2/lcsc/2304140030_TDK-C3225X7R2E104KT020U_C76688.pdf; ComponentLink2Description: JLCPCB Part URL; ComponentLink2URL: https://jlcpcb.com/partdetail/C76688; ComponentLink3Description: LCSC Part URL; ComponentLink3URL: https://lcsc.com/product-detail/Multilayer-Ceramic-Capacitors-MLCC---SMD-SMT_TDK-TDK-C3225X7R2E104KT020U_C76688.html
footprint CAP-1210 (1210 (3225M) Capacitor)
pins: 1, 2

## C3225X7R2E224KT0L0U
designator C?  Capacitance: 220nF  (hidden comment: *)
Capacitor, Ceramic (MLCC), 220nF, ±10%, 250V, X7R, ±10%, SMD 1210; Manufacturer: TDK; Manufacturer Part Number: C3225X7R2E224KT0L0U; Package Size: 1210; JLCPCB Basic Part: No; JLCPCB Part Number: C342726; Supplier 1: LCSC; Category: Capacitors - MLCC; Supplier Part Number 1: C342726; Tolerance: ±10%; Voltage Rating: 250V; Temperature Coefficient: X7R; RoHS: Yes; ComponentLink1Description: Datasheet; ComponentLink1URL: https://wmsc.lcsc.com/wmsc/upload/file/pdf/v2/lcsc/2304140030_TDK-C3225X7R2E224KT0L0U_C342726.pdf; ComponentLink2Description: JLCPCB Part URL; ComponentLink2URL: https://jlcpcb.com/partdetail/C342726; ComponentLink3Description: LCSC Part URL; ComponentLink3URL: https://lcsc.com/product-detail/Multilayer-Ceramic-Capacitors-MLCC---SMD-SMT_TDK-TDK-C3225X7R2E224KT0L0U_C342726.html
footprint CAP-1210 (1210 (3225M) Capacitor)
pins: 1, 2

## C3225X7R2J473KT020U
designator C?  Capacitance: 47nF  (hidden comment: *)
Capacitor, Ceramic (MLCC), 47nF, ±10%, 630V, X7R, ±10%, SMD 1210; Manufacturer: TDK; Manufacturer Part Number: C3225X7R2J473KT020U; Package Size: 1210; JLCPCB Basic Part: No; JLCPCB Part Number: C342772; Supplier 1: LCSC; Category: Capacitors - MLCC; Supplier Part Number 1: C342772; Tolerance: ±10%; Voltage Rating: 630V; Temperature Coefficient: X7R; RoHS: Yes; ComponentLink1Description: Datasheet; ComponentLink1URL: https://wmsc.lcsc.com/wmsc/upload/file/pdf/v2/lcsc/2304140030_TDK-C3225X7R2J473KT020U_C342772.pdf; ComponentLink2Description: JLCPCB Part URL; ComponentLink2URL: https://jlcpcb.com/partdetail/C342772; ComponentLink3Description: LCSC Part URL; ComponentLink3URL: https://lcsc.com/product-detail/Multilayer-Ceramic-Capacitors-MLCC---SMD-SMT_TDK-TDK-C3225X7R2J473KT020U_C342772.html
footprint CAP-1210 (1210 (3225M) Capacitor)
pins: 1, 2

## C3225X7R2J683KT0L0U
designator C?  Capacitance: 68nF  (hidden comment: *)
Capacitor, Ceramic (MLCC), 68nF, ±10%, 630V, X7R, ±10%, SMD 1210; Manufacturer: TDK; Manufacturer Part Number: C3225X7R2J683KT0L0U; Package Size: 1210; JLCPCB Basic Part: No; JLCPCB Part Number: C342738; Supplier 1: LCSC; Category: Capacitors - MLCC; Supplier Part Number 1: C342738; Tolerance: ±10%; Voltage Rating: 630V; Temperature Coefficient: X7R; RoHS: Yes; ComponentLink1Description: Datasheet; ComponentLink1URL: https://wmsc.lcsc.com/wmsc/upload/file/pdf/v2/lcsc/2304140030_TDK-C3225X7R2J683KT0L0U_C342738.pdf; ComponentLink2Description: JLCPCB Part URL; ComponentLink2URL: https://jlcpcb.com/partdetail/C342738; ComponentLink3Description: LCSC Part URL; ComponentLink3URL: https://lcsc.com/product-detail/Multilayer-Ceramic-Capacitors-MLCC---SMD-SMT_TDK-TDK-C3225X7R2J683KT0L0U_C342738.html
footprint CAP-1210 (1210 (3225M) Capacitor)
pins: 1, 2

## C3225X7S0J476MT000N
designator C?  Capacitance: 47uF  (hidden comment: *)
Capacitor, Ceramic (MLCC), 47uF, ±20%, 6.3V, X7S, ±20%, SMD 1210; Manufacturer: TDK; Manufacturer Part Number: C3225X7S0J476MT000N; Package Size: 1210; JLCPCB Basic Part: No; JLCPCB Part Number: C432930; Supplier 1: LCSC; Category: Capacitors - MLCC; Supplier Part Number 1: C432930; Tolerance: ±20%; Voltage Rating: 6.3V; Temperature Coefficient: X7S; RoHS: Yes; ComponentLink1Description: Datasheet; ComponentLink1URL: https://wmsc.lcsc.com/wmsc/upload/file/pdf/v2/lcsc/2304140030_TDK-C3225X7S0J476MT000N_C432930.pdf; ComponentLink2Description: JLCPCB Part URL; ComponentLink2URL: https://jlcpcb.com/partdetail/C432930; ComponentLink3Description: LCSC Part URL; ComponentLink3URL: https://lcsc.com/product-detail/Multilayer-Ceramic-Capacitors-MLCC---SMD-SMT_TDK-TDK-C3225X7S0J476MT000N_C432930.html
footprint CAP-1210 (1210 (3225M) Capacitor)
pins: 1, 2

## C3225X7S1H106KT000N
designator C?  Capacitance: 10uF  (hidden comment: *)
Capacitor, Ceramic (MLCC), 10uF, ±10%, 50V, X7S, ±10%, SMD 1210; Manufacturer: TDK; Manufacturer Part Number: C3225X7S1H106KT000N; Package Size: 1210; JLCPCB Basic Part: No; JLCPCB Part Number: C342672; Supplier 1: LCSC; Category: Capacitors - MLCC; Supplier Part Number 1: C342672; Tolerance: ±10%; Voltage Rating: 50V; Temperature Coefficient: X7S; RoHS: Yes; ComponentLink1Description: Datasheet; ComponentLink1URL: https://wmsc.lcsc.com/wmsc/upload/file/pdf/v2/lcsc/2304140030_TDK-C3225X7S1H106KT000N_C342672.pdf; ComponentLink2Description: JLCPCB Part URL; ComponentLink2URL: https://jlcpcb.com/partdetail/C342672; ComponentLink3Description: LCSC Part URL; ComponentLink3URL: https://lcsc.com/product-detail/Multilayer-Ceramic-Capacitors-MLCC---SMD-SMT_TDK-TDK-C3225X7S1H106KT000N_C342672.html
footprint CAP-1210 (1210 (3225M) Capacitor)
pins: 1, 2

## C3225X7S1H106MT000S
designator C?  Capacitance: 10uF  (hidden comment: *)
Capacitor, Ceramic (MLCC), 10uF, ±20%, 50V, X7S, ±20%, SMD 1210; Manufacturer: TDK; Manufacturer Part Number: C3225X7S1H106MT000S; Package Size: 1210; JLCPCB Basic Part: No; JLCPCB Part Number: C694199; Supplier 1: LCSC; Category: Capacitors - MLCC; Supplier Part Number 1: C694199; Tolerance: ±20%; Voltage Rating: 50V; Temperature Coefficient: X7S; RoHS: Yes; ComponentLink1Description: Datasheet; ComponentLink1URL: https://wmsc.lcsc.com/wmsc/upload/file/pdf/v2/lcsc/2304140030_TDK-C3225X7S1H106MT000S_C694199.pdf; ComponentLink2Description: JLCPCB Part URL; ComponentLink2URL: https://jlcpcb.com/partdetail/C694199; ComponentLink3Description: LCSC Part URL; ComponentLink3URL: https://lcsc.com/product-detail/Multilayer-Ceramic-Capacitors-MLCC---SMD-SMT_TDK-TDK-C3225X7S1H106MT000S_C694199.html
footprint CAP-1210 (1210 (3225M) Capacitor)
pins: 1, 2

## C3225X7S2A335KT000N
designator C?  Capacitance: 3.3uF  (hidden comment: *)
Capacitor, Ceramic (MLCC), 3.3uF, ±10%, 100V, X7S, ±10%, SMD 1210; Manufacturer: TDK; Manufacturer Part Number: C3225X7S2A335KT000N; Package Size: 1210; JLCPCB Basic Part: No; JLCPCB Part Number: C575409; Supplier 1: LCSC; Category: Capacitors - MLCC; Supplier Part Number 1: C575409; Tolerance: ±10%; Voltage Rating: 100V; Temperature Coefficient: X7S; RoHS: Yes; ComponentLink1Description: Datasheet; ComponentLink1URL: https://wmsc.lcsc.com/wmsc/upload/file/pdf/v2/lcsc/2304140030_TDK-C3225X7S2A335KT000N_C575409.pdf; ComponentLink2Description: JLCPCB Part URL; ComponentLink2URL: https://jlcpcb.com/partdetail/C575409; ComponentLink3Description: LCSC Part URL; ComponentLink3URL: https://lcsc.com/product-detail/Multilayer-Ceramic-Capacitors-MLCC---SMD-SMT_TDK-TDK-C3225X7S2A335KT000N_C575409.html
footprint CAP-1210 (1210 (3225M) Capacitor)
pins: 1, 2

## C3225X7S2A475KT000N
designator C?  Capacitance: 4.7uF  (hidden comment: *)
Capacitor, Ceramic (MLCC), 4.7uF, ±10%, 100V, X7S, ±10%, SMD 1210; Manufacturer: TDK; Manufacturer Part Number: C3225X7S2A475KT000N; Package Size: 1210; JLCPCB Basic Part: No; JLCPCB Part Number: C342614; Supplier 1: LCSC; Category: Capacitors - MLCC; Supplier Part Number 1: C342614; Tolerance: ±10%; Voltage Rating: 100V; Temperature Coefficient: X7S; RoHS: Yes; ComponentLink1Description: Datasheet; ComponentLink1URL: https://wmsc.lcsc.com/wmsc/upload/file/pdf/v2/lcsc/2304140030_TDK-C3225X7S2A475KT000N_C342614.pdf; ComponentLink2Description: JLCPCB Part URL; ComponentLink2URL: https://jlcpcb.com/partdetail/C342614; ComponentLink3Description: LCSC Part URL; ComponentLink3URL: https://lcsc.com/product-detail/Multilayer-Ceramic-Capacitors-MLCC---SMD-SMT_TDK-TDK-C3225X7S2A475KT000N_C342614.html
footprint CAP-1210 (1210 (3225M) Capacitor)
pins: 1, 2

## C3225X7S2A475MT000N
designator C?  Capacitance: 4.7uF  (hidden comment: *)
Capacitor, Ceramic (MLCC), 4.7uF, ±20%, 100V, X7S, ±20%, SMD 1210; Manufacturer: TDK; Manufacturer Part Number: C3225X7S2A475MT000N; Package Size: 1210; JLCPCB Basic Part: No; JLCPCB Part Number: C432931; Supplier 1: LCSC; Category: Capacitors - MLCC; Supplier Part Number 1: C432931; Tolerance: ±20%; Voltage Rating: 100V; Temperature Coefficient: X7S; RoHS: Yes; ComponentLink1Description: Datasheet; ComponentLink1URL: https://wmsc.lcsc.com/wmsc/upload/file/pdf/v2/lcsc/2304140030_TDK-C3225X7S2A475MT000N_C432931.pdf; ComponentLink2Description: JLCPCB Part URL; ComponentLink2URL: https://jlcpcb.com/partdetail/C432931; ComponentLink3Description: LCSC Part URL; ComponentLink3URL: https://lcsc.com/product-detail/Multilayer-Ceramic-Capacitors-MLCC---SMD-SMT_TDK-TDK-C3225X7S2A475MT000N_C432931.html
footprint CAP-1210 (1210 (3225M) Capacitor)
pins: 1, 2

## C3225X7T2E334KT000N
designator C?  Capacitance: 330nF  (hidden comment: *)
Capacitor, Ceramic (MLCC), 330nF, ±10%, 250V, X7T, ±10%, SMD 1210; Manufacturer: TDK; Manufacturer Part Number: C3225X7T2E334KT000N; Package Size: 1210; JLCPCB Basic Part: No; JLCPCB Part Number: C342685; Supplier 1: LCSC; Category: Capacitors - MLCC; Supplier Part Number 1: C342685; Tolerance: ±10%; Voltage Rating: 250V; Temperature Coefficient: X7T; RoHS: Yes; ComponentLink1Description: Datasheet; ComponentLink1URL: https://wmsc.lcsc.com/wmsc/upload/file/pdf/v2/lcsc/2304140030_TDK-C3225X7T2E334KT000N_C342685.pdf; ComponentLink2Description: JLCPCB Part URL; ComponentLink2URL: https://jlcpcb.com/partdetail/C342685; ComponentLink3Description: LCSC Part URL; ComponentLink3URL: https://lcsc.com/product-detail/Multilayer-Ceramic-Capacitors-MLCC---SMD-SMT_TDK-TDK-C3225X7T2E334KT000N_C342685.html
footprint CAP-1210 (1210 (3225M) Capacitor)
pins: 1, 2

## C3225X7T2J104KT000N
designator C?  Capacitance: 100nF  (hidden comment: *)
Capacitor, Ceramic (MLCC), 100nF, ±10%, 630V, X7T, ±10%, SMD 1210; Manufacturer: TDK; Manufacturer Part Number: C3225X7T2J104KT000N; Package Size: 1210; JLCPCB Basic Part: No; JLCPCB Part Number: C342668; Supplier 1: LCSC; Category: Capacitors - MLCC; Supplier Part Number 1: C342668; Tolerance: ±10%; Voltage Rating: 630V; Temperature Coefficient: X7T; RoHS: Yes; ComponentLink1Description: Datasheet; ComponentLink1URL: https://wmsc.lcsc.com/wmsc/upload/file/pdf/v2/lcsc/2304140030_TDK-C3225X7T2J104KT000N_C342668.pdf; ComponentLink2Description: JLCPCB Part URL; ComponentLink2URL: https://jlcpcb.com/partdetail/C342668; ComponentLink3Description: LCSC Part URL; ComponentLink3URL: https://lcsc.com/product-detail/Multilayer-Ceramic-Capacitors-MLCC---SMD-SMT_TDK-TDK-C3225X7T2J104KT000N_C342668.html
footprint CAP-1210 (1210 (3225M) Capacitor)
pins: 1, 2

## C3225X7T2J154KT000N
designator C?  Capacitance: 150nF  (hidden comment: *)
Capacitor, Ceramic (MLCC), 150nF, ±10%, 630V, X7T, ±10%, SMD 1210; Manufacturer: TDK; Manufacturer Part Number: C3225X7T2J154KT000N; Package Size: 1210; JLCPCB Basic Part: No; JLCPCB Part Number: C342667; Supplier 1: LCSC; Category: Capacitors - MLCC; Supplier Part Number 1: C342667; Tolerance: ±10%; Voltage Rating: 630V; Temperature Coefficient: X7T; RoHS: Yes; ComponentLink1Description: Datasheet; ComponentLink1URL: https://wmsc.lcsc.com/wmsc/upload/file/pdf/v2/lcsc/2304140030_TDK-C3225X7T2J154KT000N_C342667.pdf; ComponentLink2Description: JLCPCB Part URL; ComponentLink2URL: https://jlcpcb.com/partdetail/C342667; ComponentLink3Description: LCSC Part URL; ComponentLink3URL: https://lcsc.com/product-detail/Multilayer-Ceramic-Capacitors-MLCC---SMD-SMT_TDK-TDK-C3225X7T2J154KT000N_C342667.html
footprint CAP-1210 (1210 (3225M) Capacitor)
pins: 1, 2

## C3225X7T2W224KT000N
designator C?  Capacitance: 220nF  (hidden comment: *)
Capacitor, Ceramic (MLCC), 220nF, ±10%, 450V, X7T, ±10%, SMD 1210; Manufacturer: TDK; Manufacturer Part Number: C3225X7T2W224KT000N; Package Size: 1210; JLCPCB Basic Part: No; JLCPCB Part Number: C342700; Supplier 1: LCSC; Category: Capacitors - MLCC; Supplier Part Number 1: C342700; Tolerance: ±10%; Voltage Rating: 450V; Temperature Coefficient: X7T; RoHS: Yes; ComponentLink1Description: Datasheet; ComponentLink1URL: https://wmsc.lcsc.com/wmsc/upload/file/pdf/v2/lcsc/2304140030_TDK-C3225X7T2W224KT000N_C342700.pdf; ComponentLink2Description: JLCPCB Part URL; ComponentLink2URL: https://jlcpcb.com/partdetail/C342700; ComponentLink3Description: LCSC Part URL; ComponentLink3URL: https://lcsc.com/product-detail/Multilayer-Ceramic-Capacitors-MLCC---SMD-SMT_TDK-TDK-C3225X7T2W224KT000N_C342700.html
footprint CAP-1210 (1210 (3225M) Capacitor)
pins: 1, 2

## CC1210JKNPO0BN103
designator C?  Capacitance: 10nF  (hidden comment: *)
Capacitor, Ceramic (MLCC), 10nF, ±5%, 100V, NP0, ±5%, SMD 1210; Manufacturer: YAGEO; Manufacturer Part Number: CC1210JKNPO0BN103; Package Size: 1210; JLCPCB Basic Part: No; JLCPCB Part Number: C2310521; Supplier 1: LCSC; Category: Capacitors - MLCC; Supplier Part Number 1: C2310521; Tolerance: ±5%; Voltage Rating: 100V; Temperature Coefficient: NP0; RoHS: Yes; ComponentLink1Description: Datasheet; ComponentLink1URL: https://wmsc.lcsc.com/wmsc/upload/file/pdf/v2/lcsc/2304140030_YAGEO-CC1210JKNPO0BN103_C2310521.pdf; ComponentLink2Description: JLCPCB Part URL; ComponentLink2URL: https://jlcpcb.com/partdetail/C2310521; ComponentLink3Description: LCSC Part URL; ComponentLink3URL: https://lcsc.com/product-detail/Multilayer-Ceramic-Capacitors-MLCC---SMD-SMT_YAGEO-YAGEO-CC1210JKNPO0BN103_C2310521.html
footprint CAP-1210 (1210 (3225M) Capacitor)
pins: 1, 2
